# Altium integrated library Cap-El-THP_V2.IntLib: 241 symbols (part 2 of 2)
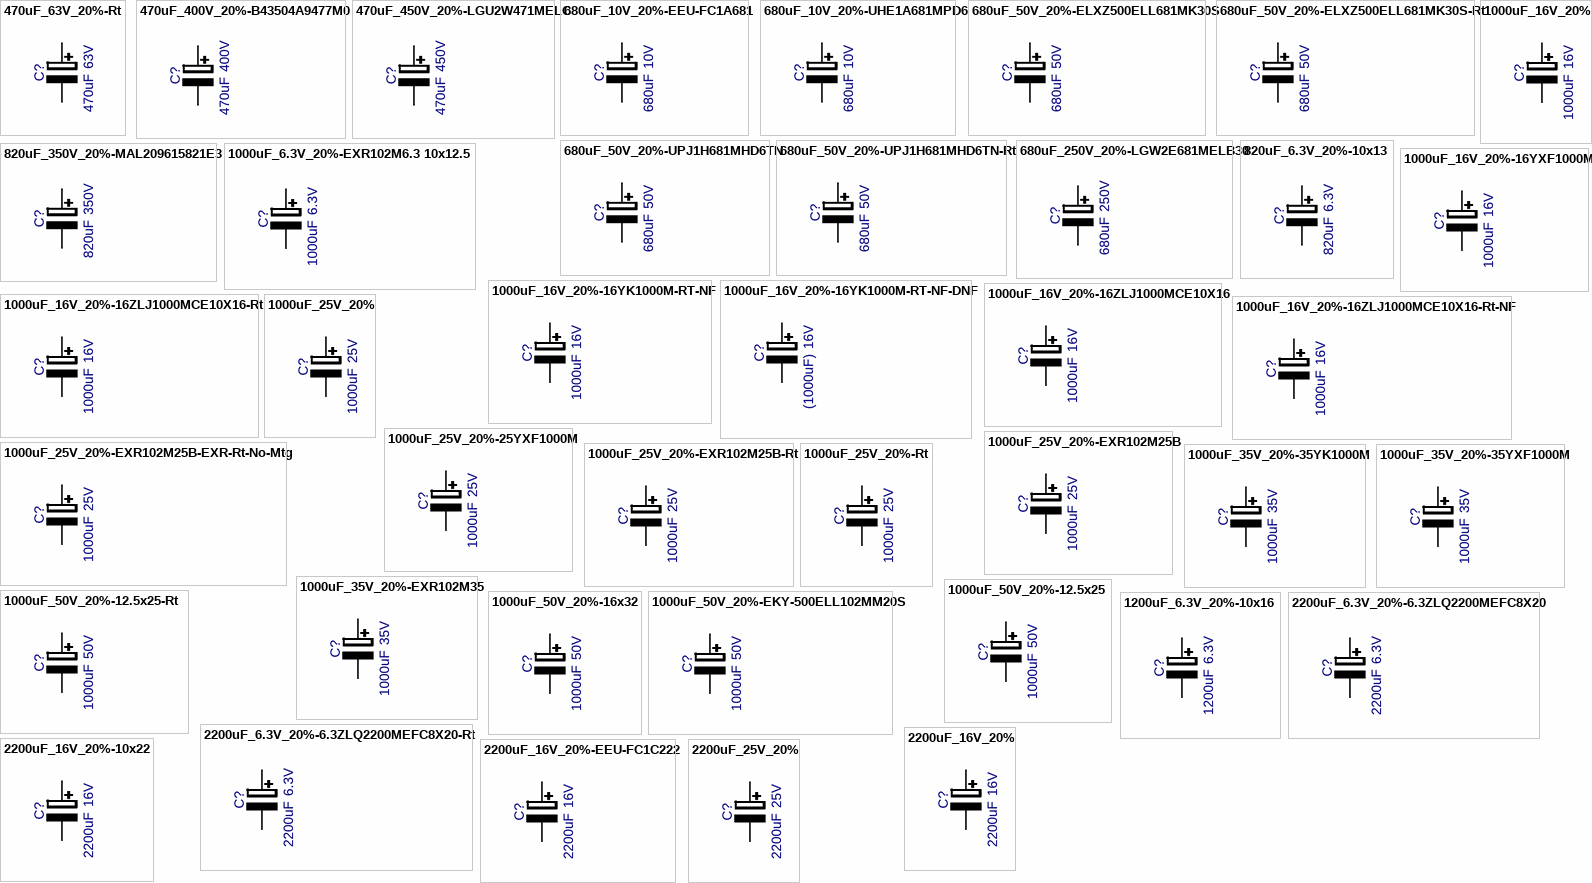
[diagram p7: symbols 470uF_63V_20%-Rt to 2200uF_25V_20%]

## 1000uF_16V_20%-16YK1000M-RT-NF
designator C?, comment value 1000uF  Voltage: 16V  (hidden comment: 16YK1000M)
Cap Electrolytic THP Radial; Manufacturer: Rubycon; Tol: 20%; Part Number: 16YK1000M; Package: EL-RAD-10x16-RT-NF; EDM-PN: *; Text2: *; Text1: *
footprint EL-RAD-10X16-RT-NF (Capacitor, Electrolytic, THP, Radial, Dia 10.00mm, Pitch 5.00mm)
pins: 1, 2

## 1000uF_16V_20%-16YK1000M-RT-NF-DNF
designator C?, comment value (1000uF)  Voltage: 16V  (hidden comment: 16YK1000M)
Cap Electrolytic THP Radial - Do not Fit; Manufacturer: Rubycon; Part Number: DNF - 16YK1000M; Tol: 20%; Package: EL-RAD-10x16-RT-NF; EDM-PN: *; Text2: *; Text1: *
footprint EL-RAD-10X16-RT-NF (Capacitor, Electrolytic, THP, Radial, Dia 10.00mm, Pitch 5.00mm)
pins: 1, 2

## 1000uF_16V_20%-16YXF1000M
designator C?, comment value 1000uF  Voltage: 16V  (hidden comment: 16YXF1000M)
Cap Electrolytic THP Radial - Low Imp; Manufacturer: Rubycon; Tol: 20%; Part Number: 16YXF1000M; Package: EL-RAD-10x20; EDM-PN: *; Text2: *; Text1: *
footprint EL-RAD-10x20 (Capacitor, Electrolytic, THP, Radial, Dia 10.00mm, Pitch 5.00mm)
pins: 1, 2

## 1000uF_16V_20%-16ZLJ1000MCE10X16
designator C?, comment value 1000uF  Voltage: 16V  (hidden comment: 16ZLJ1000MCE10X16)
Cap Electrolytic THP Radial; Manufacturer: Rubycon; EDM-PN: CAP1262; Tol: 20%; Part Number: 16ZLJ1000MCE10X16; Package: EL-RAD-10x17.5; Text2: *; Text1: *
footprint EL-RAD-10X17.5 (Capacitor, Electrolytic, THP, Radial, Dia 10.00mm, Pitch 5.00mm)
pins: 1, 2

## 1000uF_16V_20%-16ZLJ1000MCE10X16-Rt
designator C?, comment value 1000uF  Voltage: 16V  (hidden comment: 16ZLJ1000MCE10X16)
Cap Electrolytic THP Radial; Manufacturer: Rubycon; EDM-PN: CAP1262; Tol: 20%; Part Number: 16ZLJ1000MCE10X16; Package: EL-RAD-10x17.5-RT; Text2: *; Text1: *
footprint EL-RAD-10X17.5-RT (Capacitor, Electrolytic, THP, Radial, Dia 10.00mm, Pitch 5.00mm)
pins: 1, 2

## 1000uF_16V_20%-16ZLJ1000MCE10X16-Rt-NF
designator C?, comment value 1000uF  Voltage: 16V  (hidden comment: 16ZLJ1000MCE10X16)
Cap Electrolytic THP Radial; Manufacturer: Rubycon; EDM-PN: CAP1262; Tol: 20%; Part Number: 16ZLJ1000MCE10X16; Package: EL-RAD-10x17.5-RT-NF; Text2: *; Text1: *
footprint EL-RAD-10X17.5-RT-NF (Capacitor, Electrolytic, THP, Radial, Dia 10.00mm, Pitch 5.00mm)
pins: 1, 2

## 1000uF_25V_20%
designator C?, comment value 1000uF  Voltage: 25V  (hidden comment: CAP-EL_1000uF_25V_20%)
Cap Electrolytic THP Radial; Manufacturer: Various; Part Number: 1000uF 25V 20%; Tol: 20%; Package: EL-RAD-10x20; EDM-PN: *; Text2: *; Text1: *
footprint EL-RAD-10X20 (Capacitor, Electrolytic, THP, Radial, Dia 10.00mm, Pitch 5.00mm)
pins: 1, 2

## 1000uF_25V_20%-25YXF1000M
designator C?, comment value 1000uF  Voltage: 25V  (hidden comment: 25YXF1000M)
Cap Electrolytic THP Radial - Low Imp; Manufacturer: Rubycon; Tol: 20%; Reutech PN: 5910-EL-0110; Part Number: 25YXF1000M; Package: EL-RAD-12.5x20; EDM-PN: *; Text2: *; Text1: *
footprint EL-RAD-12.5x20 (Capacitor, Electrolytic, THP, Radial, Dia 12.50mm, Pitch 5.00mm)
pins: 1, 2

## 1000uF_25V_20%-EXR102M25B
designator C?, comment value 1000uF  Voltage: 25V  (hidden comment: EXR102M25B)
Cap Electrolytic THP Radial - Low Imp; Manufacturer: Hitano; Tol: 20%; Part Number: EXR102M25B; Package: EL-RAD-13x21; EDM-PN: *; Text2: *; Text1: *
footprint EL-RAD-13x21 (Capacitor, Electrolytic, THP, Radial, Dia 13.0mm, Pitch 5.00mm)
pins: 1, 2

## 1000uF_25V_20%-EXR102M25B-EXR-Rt-No-Mtg
designator C?, comment value 1000uF  Voltage: 25V  (hidden comment: EXR102M25B)
Cap Electrolytic THP Radial - Low Imp; Manufacturer: Hitano; Tol: 20%; Part Number: EXR102M25B; Package: EL-RAD-13x21-RT-No_MTG; EDM-PN: *; Text2: *; Text1: *
footprint EL-RAD-13x21-RT-No_MTG (Capacitor, Electrolytic, THP, Radial, Dia 13.0mm, Pitch 5.00mm)
pins: 1, 2

## 1000uF_25V_20%-EXR102M25B-Rt
designator C?, comment value 1000uF  Voltage: 25V  (hidden comment: EXR102M25B)
Cap Electrolytic THP Radial - Low Imp; Manufacturer: Hitano; Tol: 20%; Part Number: EXR102M25B; Package: EL-RAD-13x21-Rt; EDM-PN: *; Text2: *; Text1: *
footprint EL-RAD-13x21-RT (Capacitor, Electrolytic, THP, Radial, Dia 13.0mm, Pitch 5.00mm)
pins: 1, 2

## 1000uF_25V_20%-Rt
designator C?, comment value 1000uF  Voltage: 25V  (hidden comment: CAP-EL_1000uF_25V_20%)
Cap Electrolytic THP Radial; Manufacturer: Various; Part Number: 1000uF 25V 20%; Tol: 20%; Package: EL-RAD-10x20-Rt; EDM-PN: *; Text2: *; Text1: *
footprint EL-RAD-10X20-RT (Capacitor, Electrolytic, THP, Radial, Dia 10.0mm, Pitch 5.0mm)
pins: 1, 2

## 1000uF_35V_20%-35YK1000M
designator C?, comment value 1000uF  Voltage: 35V  (hidden comment: 35YK1000M)
Cap Electrolytic THP Radial; Manufacturer: Rubycon; Tol: 20%; Part Number: 35YK1000M; Package: EL-RAD-12.5x20; EDM-PN: *; Text2: *; Text1: *
footprint EL-RAD-12.5x20 (Capacitor, Electrolytic, THP, Radial, Dia 12.50mm, Pitch 5.00mm)
pins: 1, 2

## 1000uF_35V_20%-35YXF1000M
designator C?, comment value 1000uF  Voltage: 35V  (hidden comment: 35YXF1000M)
Cap Electrolytic THP Radial - Low Imp; Manufacturer: Rubycon; Tol: 20%; Reutech PN: 5910-EL-0063; Part Number: 35YXF1000M; Package: EL-RAD-12.5x25; EDM-PN: *; Text2: *; Text1: *
footprint EL-RAD-12.5x25 (Capacitor, Electrolytic, THP, Radial, Dia 12.50mm, Pitch 5.00mm)
pins: 1, 2

## 1000uF_35V_20%-EXR102M35
designator C?, comment value 1000uF  Voltage: 35V  (hidden comment: EXR102M35)
Cap Electrolytic THP Radial; Manufacturer: Hitano; Tol: 20%; Part Number: EXR102M35; Package: EL-RAD-13x26; EDM-PN: *; Text2: *; Text1: *
footprint EL-RAD-13x26 (Capacitor, Electrolytic, THP, Radial, Dia 13.0mm, Pitch 5.00mm)
pins: 1, 2

## 1000uF_50V_20%-12.5x25
designator C?, comment value 1000uF  Voltage: 50V  (hidden comment: CAP-EL_1000uF_50V_20%-12.5x25)
Cap Electrolytic THP Radial; Manufacturer: Various; Part Number: 1000uF_50V_20% (12.5x25); Tol: 20%; Package: EL-RAD-12.5X25; EDM-PN: *; Text2: *; Text1: *
footprint EL-RAD-12.5x25 (Capacitor, Electrolytic, THP, Radial, Dia 12.50mm, Pitch 5.00mm)
pins: 1, 2

## 1000uF_50V_20%-12.5x25-Rt
designator C?, comment value 1000uF  Voltage: 50V  (hidden comment: CAP-EL_1000uF_50V_20%-12.5x25)
Cap Electrolytic THP Radial; Manufacturer: Various; Part Number: 1000uF_50V_20% (12.5x25); Tol: 20%; Package: EL-RAD-12.5X25-Rt; EDM-PN: *; Text2: *; Text1: *
footprint EL-RAD-12.5x25-Rt (Capacitor, Electrolytic, THP, Radial, Dia 12.50mm, Pitch 5.00mm)
pins: 1, 2

## 1000uF_50V_20%-16x32
designator C?, comment value 1000uF  Voltage: 50V  (hidden comment: CAP-EL_1000uF_50V_20%)
Cap Electrolytic THP Radial (16x32mm); Manufacturer: Various; Part Number: 1000uF_50V_20%(16x32); Tol: 20%; Package: EL-RAD-16x31.5; EDM-PN: *; Text2: *; Text1: *
footprint EL-RAD-16X31.5 (Capacitor, Electrolytic, THP, Radial, Dia 16mm, Pitch 7.5mm)
pins: 1, 2

## 1000uF_50V_20%-EKY-500ELL102MM20S
designator C?, comment value 1000uF  Voltage: 50V  (hidden comment: EKY-500ELL102MM20S)
Cap Electrolytic THP Radial (18x20mm); Manufacturer: United Chemi-Con; Tol: 20%; Part Number: EKY-500ELL102MM20S; Package: EL-RAD-18x20; EDM-PN: *; Text2: *; Text1: *
footprint EL-RAD-18x20 (Capacitor, Electrolytic, THP, Radial, Dia 18.00mm, Pitch 7.50mm)
pins: 1, 2

## 1200uF_6.3V_20%-10x16
designator C?, comment value 1200uF  Voltage: 6.3V  (hidden comment: CAP-EL_1200uF_6.3V_20%)
Cap Electrolytic THP Radial; Manufacturer: Various; Part Number: 1200uF_6.3V_20%(10x16); Tol: 20%; Package: EL-RAD-10x16; EDM-PN: *; Text2: *; Text1: *
footprint EL-RAD-10x16 (Capacitor, Electrolytic, THP, Radial, Dia 10.00mm, Pitch 5.00mm)
pins: 1, 2

## 2200uF_6.3V_20%-6.3ZLQ2200MEFC8X20
designator C?, comment value 2200uF  Voltage: 6.3V  (hidden comment: 6.3ZLQ2200MEFC8X20)
Cap Electrolytic THP Radial (8x22mm); Manufacturer: Rubycon; Tol: 20%; Part Number: 6.3ZLQ2200MEFC8X20; Package: EL-RAD-8X22-Black; EDM-PN: *; Text2: *; Text1: *
footprint EL-RAD-8X22-Black (Capacitor, Electrolytic, THP, Radial, Dia 8.00mm, Pitch 3.50mm)
pins: 1, 2

## 2200uF_6.3V_20%-6.3ZLQ2200MEFC8X20-Rt
designator C?, comment value 2200uF  Voltage: 6.3V  (hidden comment: 6.3ZLQ2200MEFC8X20)
Cap Electrolytic THP Radial (8x22mm); Manufacturer: Rubycon; Tol: 20%; Part Number: 6.3ZLQ2200MEFC8X20; Package: EL-RAD-8X22-Black-Rt; EDM-PN: *; Text2: *; Text1: *
footprint EL-RAD-8X22-Black-RT (Capacitor, Electrolytic, THP, Radial, Dia 8.00mm, Pitch 3.50mm)
pins: 1, 2

## 2200uF_16V_20%
designator C?, comment value 2200uF  Voltage: 16V  (hidden comment: CAP-EL_2200uF_16V_20%)
Cap Electrolytic THP Radial; Manufacturer: Various; Tol: 20%; Part Number: CAP-EL_2200uF_16V_20%; Package: EL-RAD-12.5X20; EDM-PN: *; Text2: *; Text1: *
footprint EL-RAD-12.5x20 (Capacitor, Electrolytic, THP, Radial, Dia 12.50mm, Pitch 5.00mm)
pins: 1, 2

## 2200uF_16V_20%-10x22
designator C?, comment value 2200uF  Voltage: 16V  (hidden comment: CAP-EL_2200uF_16V_20%-10x22)
Cap Electrolytic THP Radial (10x22); Manufacturer: Various; Part Number: CAP-EL_2200uF_16V_20% (10x22); Tol: 20%; Package: EL-RAD-10X22; EDM-PN: *; Text2: *; Text1: *
footprint EL-RAD-10X22 (Capacitor, Electrolytic, THP, Radial, Dia 10.00mm, Pitch 5.00mm)
pins: 1, 2

## 2200uF_16V_20%-EEU-FC1C222
designator C?, comment value 2200uF  Voltage: 16V  (hidden comment: EEU-FC1C222)
Cap Electrolytic THP Radial EEU-FC; Manufacturer: Various; Tol: 20%; Part Number: EEU-FC1C222; Package: EL-RAD-12.5X25; EDM-PN: *; Text2: *; Text1: *
footprint EL-RAD-12.5x25 (Capacitor, Electrolytic, THP, Radial, Dia 12.50mm, Pitch 5.00mm)
pins: 1, 2

## 2200uF_25V_20%
designator C?, comment value 2200uF  Voltage: 25V  (hidden comment: CAP-EL_2200uF_25V_20%)
Cap Electrolytic THP Radial; Manufacturer: Various; Tol: 20%; Part Number: CAP-EL_2200uF_25V_20%; Package: EL-RAD-12.5X25; EDM-PN: *; Text2: *; Text1: *
footprint EL-RAD-12.5x25 (Capacitor, Electrolytic, THP, Radial, Dia 12.50mm, Pitch 5.00mm)
pins: 1, 2

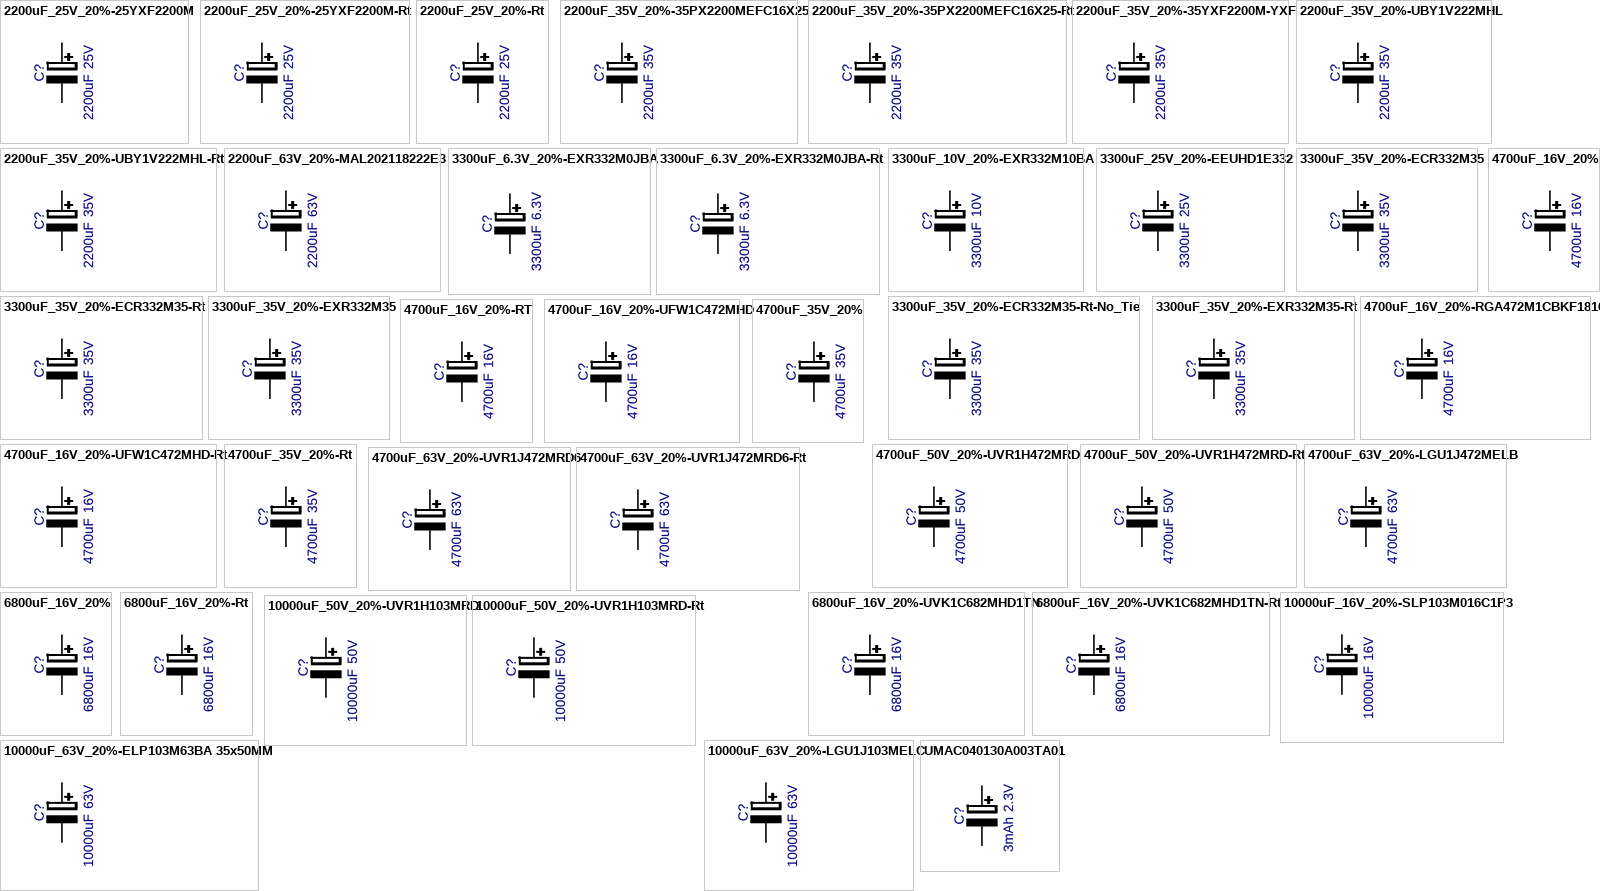
[diagram p5: symbols 2200uF_25V_20%-25YXF2200M to UMAC040130A003TA01]

## 2200uF_25V_20%-25YXF2200M
designator C?, comment value 2200uF  Voltage: 25V  (hidden comment: 25YXF2200M)
Cap Electrolytic THP Radial - Low Imp; Manufacturer: Rubycon; Tol: 20%; Part Number: 25YXF2200M; Package: EL-RAD-16x25; EDM-PN: *; Text2: *; Text1: *
footprint EL-RAD-16x25 (Capacitor, Electrolytic, THP, Radial, Dia 16.0mm, Pitch 7.50mm)
pins: 1, 2

## 2200uF_25V_20%-25YXF2200M-Rt
designator C?, comment value 2200uF  Voltage: 25V  (hidden comment: 25YXF2200M)
Cap Electrolytic THP Radial - Low Imp; Manufacturer: Rubycon; Tol: 20%; Part Number: 25YXF2200M; Package: EL-RAD-16x25-Rt; EDM-PN: *; Text2: *; Text1: *
footprint EL-RAD-16x25-RT (Capacitor, Electrolytic, THP, Radial, Dia 16.0mm, Pitch 5.00mm)
pins: 1, 2

## 2200uF_25V_20%-Rt
designator C?, comment value 2200uF  Voltage: 25V  (hidden comment: CAP-EL_2200uF_25V_20%-Rt)
Cap Electrolytic THP Radial; Manufacturer: Various; Tol: 20%; Part Number: CAP-EL_2200uF_25V_20%; Package: EL-RAD-12.5X25-RT; EDM-PN: *; Text2: *; Text1: *
footprint EL-RAD-12.5x25-RT (Capacitor, Electrolytic, THP, Radial, Dia 12.50mm, Pitch 5.00mm)
pins: 1, 2

## 2200uF_35V_20%-35PX2200MEFC16X25
designator C?, comment value 2200uF  Voltage: 35V  (hidden comment: 25YXF2200M)
Cap Electrolytic THP Radial; Manufacturer: Rubycon; Part Number: 35PX2200MEFC16X25; Tol: 20%; Package: EL-RAD-16x25; EDM-PN: *; Text2: *; Text1: *
footprint EL-RAD-16x25 (Capacitor, Electrolytic, THP, Radial, Dia 16.0mm, Pitch 7.50mm)
pins: 1, 2

## 2200uF_35V_20%-35PX2200MEFC16X25-Rt
designator C?, comment value 2200uF  Voltage: 35V  (hidden comment: 35PX2200MEFC16X25)
Cap Electrolytic THP Radial; Manufacturer: Rubycon; Tol: 20%; Part Number: 35PX2200MEFC16X25; Package: EL-RAD-16x25-Rt; EDM-PN: *; Text2: *; Text1: *
footprint EL-RAD-16x25-RT (Capacitor, Electrolytic, THP, Radial, Dia 16.0mm, Pitch 5.00mm)
pins: 1, 2

## 2200uF_35V_20%-35YXF2200M-YXF
designator C?, comment value 2200uF  Voltage: 35V  (hidden comment: 35YXF2200M)
Cap Electrolytic THP Radial - Low Imp; Manufacturer: Rubycon; Tol: 20%; Part Number: 35YXF2200M; Package: EL-RAD-16x31.5; EDM-PN: *; Text2: *; Text1: *
footprint EL-RAD-16X31.5 (Capacitor, Electrolytic, THP, Radial, Dia 16mm, Pitch 7.5mm)
pins: 1, 2

## 2200uF_35V_20%-UBY1V222MHL
designator C?, comment value 2200uF  Voltage: 35V  (hidden comment: UBY1V222MHL)
Cap Electrolytic THP Radial (12.5x33mm); Manufacturer: Nichicon; Tol: 20%; Part Number: UBY1V222MHL; Package: EL-RAD-12.5x33; EDM-PN: *; Text2: *; Text1: *
footprint EL-RAD-12.5x33 (Capacitor, Electrolytic, THP, Radial, Dia 12.50mm, Pitch 5.00mm)
pins: 1, 2

## 2200uF_35V_20%-UBY1V222MHL-Rt
designator C?, comment value 2200uF  Voltage: 35V  (hidden comment: UBY1V222MHL)
Cap Electrolytic THP Radial (12.5x33mm); Manufacturer: Nichicon; Tol: 20%; Part Number: UBY1V222MHL; Package: EL-RAD-12.5x33-RT; EDM-PN: *; Text2: *; Text1: *
footprint EL-RAD-12.5x33-RT (Capacitor, Electrolytic, THP, Radial, Dia 12.50mm, Pitch 5.00mm)
pins: 1, 2

## 2200uF_63V_20%-MAL202118222E3
designator C?, comment value 2200uF  Voltage: 63V  (hidden comment: MAL202118222E3)
Cap Electrolytic THP Axial 38x21mm; Manufacturer: Vishay; Tol: 20%; Part Number: MAL202118222E3; Package: EL-AX-38x21; EDM-PN: *; Text2: *; Text1: *
footprint EL-AX-38x21 (Cap El Axial 38.0x21.0mm)
pins: 1, 2

## 3300uF_6.3V_20%-EXR332M0JBA
designator C?, comment value 3300uF  Voltage: 6.3V  (hidden comment: EXR332M0JBA)
Cap Electrolytic THP Radial - Low Imp; Manufacturer: Hitano; EDM-PN: CAP500; Tol: 20%; Part Number: EXR332M0JBA; Package: EL-RAD-10-20; Text2: *; Text1: *
footprint EL-RAD-10x20 (Capacitor, Electrolytic, THP, Radial, Dia 10.00mm, Pitch 5.00mm)
pins: 1, 2

## 3300uF_6.3V_20%-EXR332M0JBA-Rt
designator C?, comment value 3300uF  Voltage: 6.3V  (hidden comment: EXR332M0JBA)
Cap Electrolytic THP Radial - Low Imp; Manufacturer: Hitano; EDM-PN: CAP500; Tol: 20%; Part Number: EXR332M0JBA; Package: EL-RAD-10-20-RT; Text2: *; Text1: *
footprint EL-RAD-10X20-RT (Capacitor, Electrolytic, THP, Radial, Dia 10.0mm, Pitch 5.0mm)
pins: 1, 2

## 3300uF_10V_20%-EXR332M10BA
designator C?, comment value 3300uF  Voltage: 10V  (hidden comment: EXR332M10BA)
Cap Electrolytic THP Radial - Low Imp; Manufacturer: Hitano; Tol: 20%; Part Number: EXR332M10BA; Package: EL-RAD-13-21; EDM-PN: *; Text2: *; Text1: *
footprint EL-RAD-13x21 (Capacitor, Electrolytic, THP, Radial, Dia 13.0mm, Pitch 5.00mm)
pins: 1, 2

## 3300uF_25V_20%-EEUHD1E332
designator C?, comment value 3300uF  Voltage: 25V  (hidden comment: EEUHD1E332)
Cap Electrolytic THP Radial; Manufacturer: Panasonic; Tol: 20%; Part Number: EEUHD1E332; Package: EL-RAD-12.5X25; EDM-PN: *; Text2: *; Text1: *
footprint EL-RAD-12.5x25 (Capacitor, Electrolytic, THP, Radial, Dia 12.50mm, Pitch 5.00mm)
pins: 1, 2

## 3300uF_35V_20%-ECR332M35
designator C?, comment value 3300uF  Voltage: 35V  (hidden comment: ECR332M35ECR)
Cap Electrolytic THP Radial; Manufacturer: Hitano; Tol: 20%; Part Number: ECR332M35; Package: EL-RAD-16x31.5; EDM-PN: *; Text2: *; Text1: *
footprint EL-RAD-16X31.5 (Capacitor, Electrolytic, THP, Radial, Dia 16mm, Pitch 7.5mm)
pins: 1, 2

## 3300uF_35V_20%-ECR332M35-Rt
designator C?, comment value 3300uF  Voltage: 35V  (hidden comment: ECR332M35)
Cap Electrolytic THP Radial; Manufacturer: Hitano; Tol: 20%; Part Number: ECR332M35; Package: EL-RAD-16x31.5-RT; EDM-PN: *; Text2: *; Text1: *
footprint EL-RAD-16X31.5-RT (Capacitor, Electrolytic, THP, Radial, Dia 16mm, Pitch 7.5mm)
pins: 1, 2

## 3300uF_35V_20%-ECR332M35-Rt-No_Tie
designator C?, comment value 3300uF  Voltage: 35V  (hidden comment: ECR332M35)
Cap Electrolytic THP Radial; Manufacturer: Hitano; Tol: 20%; Part Number: ECR332M35; Package: EL-RAD-16X31.5-RT-No_Tie; EDM-PN: *; Text2: *; Text1: *
footprint EL-RAD-16X31.5-RT-No_Tie (Capacitor, Electrolytic, THP, Radial, Dia 16mm, Pitch 7.5mm)
pins: 1, 2

## 3300uF_35V_20%-EXR332M35
designator C?, comment value 3300uF  Voltage: 35V  (hidden comment: EXR332M35)
Cap Electrolytic THP Radial - Low Imp; Manufacturer: Hitano; Tol: 20%; Part Number: EXR332M35; Package: EL-RAD-16x36; EDM-PN: *; Text2: *; Text1: *
footprint EL-RAD-16X36 (Capacitor, Electrolytic, THP, Radial, Dia 16mm, Pitch 7.5mm)
pins: 1, 2

## 3300uF_35V_20%-EXR332M35-Rt
designator C?, comment value 3300uF  Voltage: 35V  (hidden comment: EXR332M35)
Cap Electrolytic THP Radial - Low Imp; Manufacturer: Hitano; Tol: 20%; Part Number: EXR332M35; Package: EL-RAD-16x36-RT; EDM-PN: *; Text2: *; Text1: *
footprint EL-RAD-16X36-RT (Capacitor, Electrolytic, THP, Radial, Dia 16mm, Pitch 7.5mm)
pins: 1, 2

## 4700uF_16V_20%
designator C?, comment value 4700uF  Voltage: 16V  (hidden comment: CAP-EL_4700uF_16V_20%)
Cap Electrolytic THP Radial (16x25); Manufacturer: Various; Tol: 20%; Part Number: CAP-EL_4700uF_16V_20%; Package: EL-RAD-16x25; EDM-PN: *; Text2: *; Text1: *
footprint EL-RAD-16x25 (Capacitor, Electrolytic, THP, Radial, Dia 16.0mm, Pitch 7.50mm)
pins: 1, 2

## 4700uF_16V_20%-RGA472M1CBKF1816
designator C?, comment value 4700uF  Voltage: 16V  (hidden comment: RGA472M1CBKF1816)
Cap Electrolytic THP Radial (18x16); Manufacturer: Lelon; Tol: 20%; Part Number: RGA472M1CBKF1816; Package: EL-RAD-18x16; EDM-PN: *; Text2: *; Text1: *
footprint EL-RAD-18x16 (Capacitor, Electrolytic, THP, Radial, Dia 18.00mm, Pitch 7.50mm)
pins: 1, 2

## 4700uF_16V_20%-RT
designator C?, comment value 4700uF  Voltage: 16V  (hidden comment: CAP-EL_4700uF_16V_20%)
Cap Electrolytic THP Radial (16x25); Manufacturer: Various; Tol: 20%; Part Number: CAP-EL_4700uF_16V_20%; Package: EL-RAD-16x25-RT; EDM-PN: *; Text2: *; Text1: *
footprint EL-RAD-16x25-RT (Capacitor, Electrolytic, THP, Radial, Dia 16.0mm, Pitch 5.00mm)
pins: 1, 2

## 4700uF_16V_20%-UFW1C472MHD
designator C?, comment value 4700uF  Voltage: 16V  (hidden comment: UFW1C472MHD)
Cap Electrolytic THP Radial (16x25); Manufacturer: Nichicon; Tol: 20%; Part Number: UFW1C472MHD; Package: EL-RAD-16x25; EDM-PN: *; Text2: *; Text1: *
footprint EL-RAD-16x25 (Capacitor, Electrolytic, THP, Radial, Dia 16.0mm, Pitch 7.50mm)
pins: 1, 2

## 4700uF_16V_20%-UFW1C472MHD-Rt
designator C?, comment value 4700uF  Voltage: 16V  (hidden comment: UFW1C472MHD)
Cap Electrolytic THP Radial (16x25); Manufacturer: Nichicon; Tol: 20%; Part Number: UFW1C472MHD; Package: EL-RAD-16x25-RT; EDM-PN: *; Text2: *; Text1: *
footprint EL-RAD-16x25-Rt (Capacitor, Electrolytic, THP, Radial, Dia 16.0mm, Pitch 5.00mm)
pins: 1, 2

## 4700uF_35V_20%
designator C?, comment value 4700uF  Voltage: 35V  (hidden comment: CAP-EL_4700uF_35V_20%)
Cap Electrolytic THP Radial; Manufacturer: Various; Tol: 20%; Reutech PN: 5910-EL-0169; Part Number: CAP-EL_4700uF_35V_20%; Package: EL-RAD-18x35.5; EDM-PN: *; Text2: *; Text1: *
footprint EL-RAD-18x35.5 (Capacitor, Electrolytic, THP, Radial, Dia 18.00mm, Pitch 7.50mm)
pins: 1, 2

## 4700uF_35V_20%-Rt
designator C?, comment value 4700uF  Voltage: 35V  (hidden comment: CAP-EL_4700uF_35V_20%-Rt)
Cap Electrolytic THP Radial; Manufacturer: Various; Tol: 20%; Reutech PN: 5910-EL-0169; Part Number: CAP-EL_4700uF_35V_20%; Package: EL-RAD-18x35.5-Rt; EDM-PN: *; Text2: *; Text1: *
footprint EL-RAD-18x35.5-Rt (Capacitor, Electrolytic, THP, Radial, Dia 18.00mm, Pitch 7.50mm)
pins: 1, 2

## 4700uF_50V_20%-UVR1H472MRD
designator C?, comment value 4700uF  Voltage: 50V  (hidden comment: UVR1H472MRD)
Cap Electrolytic THP Radial; Manufacturer: Nichicon; Tol: 20%; Part Number: UVR1H472MRD; Package: EL-RAD-20x40-P10; EDM-PN: *; Text2: *; Text1: *
footprint EL-RAD-20x40-P10 (Capacitor Electrolytic THP Radial 20.0x40.0mm p=10.00mm)
pins: 1, 2

## 4700uF_50V_20%-UVR1H472MRD-Rt
designator C?, comment value 4700uF  Voltage: 50V  (hidden comment: UVR1H472MRD)
Cap Electrolytic THP Radial; Manufacturer: Nichicon; Tol: 20%; Part Number: UVR1H472MRD; Package: EL-RAD-20x40-P10-Rt; EDM-PN: *; Text2: *; Text1: *
footprint EL-RAD-20x40-P10-RT (Capacitor Electrolytic THP Radial 20.0x40.0mm p=10.00mm)
pins: 1, 2

## 4700uF_63V_20%-LGU1J472MELB
designator C?, comment value 4700uF  Voltage: 63V  (hidden comment: LGU1J472MELB)
Cap Electrolytic THP Radial Snap_in; Manufacturer: Nichicon; Tol: 20%; Part Number: LGU1J472MELB; Package: EL-RAD-30x40-2PIN-SNAP-IN; EDM-PN: *; Text2: *; Text1: *
footprint EL-RAD-30x40-2PIN-SNAP-IN (Capacitor, Electrolytic, THP, 30x40mm)
pins: 1, 2

## 4700uF_63V_20%-UVR1J472MRD6
designator C?, comment value 4700uF  Voltage: 63V  (hidden comment: UVR1J472MRD6)
Cap Electrolytic THP Radial; Manufacturer: Nichicon; Tol: 20%; Part Number: UVR1J472MRD6; Package: EL-RAD-25x40-P12.5; EDM-PN: *; Text2: *; Text1: *
footprint EL-RAD-25x40-P12.5 (Capacitor Electrolytic THP Radial 25.0x40.0mm p=12.5mm)
pins: 1, 2

## 4700uF_63V_20%-UVR1J472MRD6-Rt
designator C?, comment value 4700uF  Voltage: 63V  (hidden comment: UVR1J472MRD6)
Cap Electrolytic THP Radial; Manufacturer: Nichicon; Tol: 20%; Part Number: UVR1J472MRD6; Package: EL-RAD-25x40-P12.5-Rt; EDM-PN: *; Text2: *; Text1: *
footprint EL-RAD-25x40-P12.5-RT (Capacitor Electrolytic THP Radial 25.0x40.0mm p=12.6mm)
pins: 1, 2

## 6800uF_16V_20%
designator C?, comment value 6800uF  Voltage: 16V  (hidden comment: CAP-EL_6800uF_16V_20%)
Cap Electrolytic THP Radial; Manufacturer: Various; Tol: 20%; Part Number: CAP-EL_6800uF_16V_20%; Package: EL-RAD-16X31.5; EDM-PN: *; Text2: *; Text1: *
footprint EL-RAD-16X31.5 (Capacitor, Electrolytic, THP, Radial, Dia 16mm, Pitch 7.5mm)
pins: 1, 2

## 6800uF_16V_20%-Rt
designator C?, comment value 6800uF  Voltage: 16V  (hidden comment: CAP-EL_6800uF_16V_20%)
Cap Electrolytic THP Radial; Manufacturer: Various; Tol: 20%; Part Number: CAP-EL_6800uF_16V_20%; Package: EL-RAD-16X31.5-RT; EDM-PN: *; Text2: *; Text1: *
footprint EL-RAD-16X31.5-RT (Capacitor, Electrolytic, THP, Radial, Dia 16mm, Pitch 7.5mm)
pins: 1, 2

## 6800uF_16V_20%-UVK1C682MHD1TN
designator C?, comment value 6800uF  Voltage: 16V  (hidden comment: UVK1C682MHD1TN)
Cap Electrolytic THP Radial; Manufacturer: Nichicon; Tol: 20%; Part Number: UVK1C682MHD1TN; Package: EL-RAD-16x27; EDM-PN: *; Text2: *; Text1: *
footprint EL-RAD-16x27 (Capacitor, Electrolytic, THP, Radial, Dia 16.0mm, Pitch 7.50mm)
pins: 1, 2

## 6800uF_16V_20%-UVK1C682MHD1TN-Rt
designator C?, comment value 6800uF  Voltage: 16V  (hidden comment: UVK1C682MHD1TN)
Cap Electrolytic THP Radial; Manufacturer: Nichicon; Tol: 20%; Part Number: UVK1C682MHD1TN; Package: EL-RAD-16x27-RT; EDM-PN: *; Text2: *; Text1: *
footprint EL-RAD-16x27_RT (Capacitor, Electrolytic, THP, Radial, Dia 16.0mm, Pitch 7.50mm)
pins: 1, 2

## 10000uF_16V_20%-SLP103M016C1P3
designator C?, comment value 10000uF  Voltage: 16V  (hidden comment: SLP103M016C1P3)
Cap Electrolytic THP Radial Snap-In; Manufacturer: Cornell Dubilier; Tol: 20%; Part Number: SLP103M016C1P3; Package: EL-RAD-25x25-2PIN-SNAP-IN; EDM-PN: *; Text2: *; Text1: *
footprint EL-RAD-25x25-2PIN-SNAP-IN (Capacitor, Electrolytic, THP, 25x25mm)
pins: 1, 2

## 10000uF_50V_20%-UVR1H103MRD
designator C?, comment value 10000uF  Voltage: 50V  (hidden comment: UVR1H103MRD)
Cap Electrolytic THP Radial; Manufacturer: Nichicon; Tol: 20%; Part Number: UVR1H103MRD; Package: EL-RAD-25x50-P12.5; EDM-PN: *; Text2: *; Text1: *
footprint EL-RAD-25x50-P12.5 (Capacitor Electrolytic THP Radial 25.0x50.0mm p=12.5mm)
pins: 1, 2

## 10000uF_50V_20%-UVR1H103MRD-Rt
designator C?, comment value 10000uF  Voltage: 50V  (hidden comment: UVR1H103MRD)
Cap Electrolytic THP Radial; Manufacturer: Nichicon; Tol: 20%; Part Number: UVR1H103MRD; Package: EL-RAD-25x50-P12.5-Rt; EDM-PN: *; Text2: *; Text1: *
footprint EL-RAD-25x50-P12.5-RT (Capacitor Electrolytic THP Radial 25.0x50.0mm p=12.5mm)
pins: 1, 2

## 10000uF_63V_20%-ELP103M63BA 35x50MM
designator C?, comment value 10000uF  Voltage: 63V  (hidden comment: ELP103M63BA 35x50MM)
Cap Electrolytic THP Radial; Manufacturer: Hitano; Tol: 20%; Part Number: ELP103M63BA 35x50MM; Package: EL-RAD-35x50-2PIN-SNAP-IN; EDM-PN: *; Text2: *; Text1: *
footprint EL-RAD-35x50-2PIN-SNAP-IN (Capacitor, Electrolytic, THP, 35x50mm)
pins: 1, 2

## 10000uF_63V_20%-LGU1J103MELC
designator C?, comment value 10000uF  Voltage: 63V  (hidden comment: LGU1J103MELC)
Cap Electrolytic THP Radial; Manufacturer: Nichicon; Tol: 20%; Part Number: LGU1J103MELC; Package: EL-RAD-35x50-2PIN-SNAP-IN; EDM-PN: *; Text2: *; Text1: *
footprint EL-RAD-35x50-2PIN-SNAP-IN (Capacitor, Electrolytic, THP, 35x50mm)
pins: 1, 2

## UMAC040130A003TA01
designator C?  value 3mAh  Voltage: 2.3V  (hidden comment: UMAC040130A003TA01)
Cap (Super Cap) 2.3V 3mAh; Manufacturer: Murata; Tol: 20%; Part Number: UMAC040130A003TA01; Package: EL-RAD-4X12; EDM-PN: *; Text2: *; Text1: *
footprint EL-RAD-4X12 (Super Cap 4.0x12.0 1.5mm Picth)
pins: 1, 2

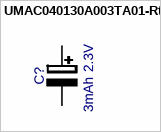
[diagram p6: symbol UMAC040130A003TA01-Rt]

## UMAC040130A003TA01-Rt
designator C?, comment value 3mAh  Voltage: 2.3V  (hidden comment: UMAC040130A003TA01)
Cap (Super Cap) 2.3V 3mAh; Manufacturer: Murata; Tol: 20%; Part Number: UMAC040130A003TA01; Package: EL-RAD-4X12-R; EDM-PN: *; Text2: *; Text1: *
footprint EL-RAD-4X12-R (Super Cap 4.0x12.0 1.5mm Picth)
pins: 1, 2